# Altium footprint library texas.PCBLIB: 168 footprints (part 6 of 14)
Each footprint in its own frame and in the unit in brackets; x right, y up, seen from the top. Pads: shape width x height; smd on the part's side, far side on the other; paste and mask are expansions set on the pad; w line width, h text height; cw(c..) or ccw(c..) is an arc to the next point about the centre after c.
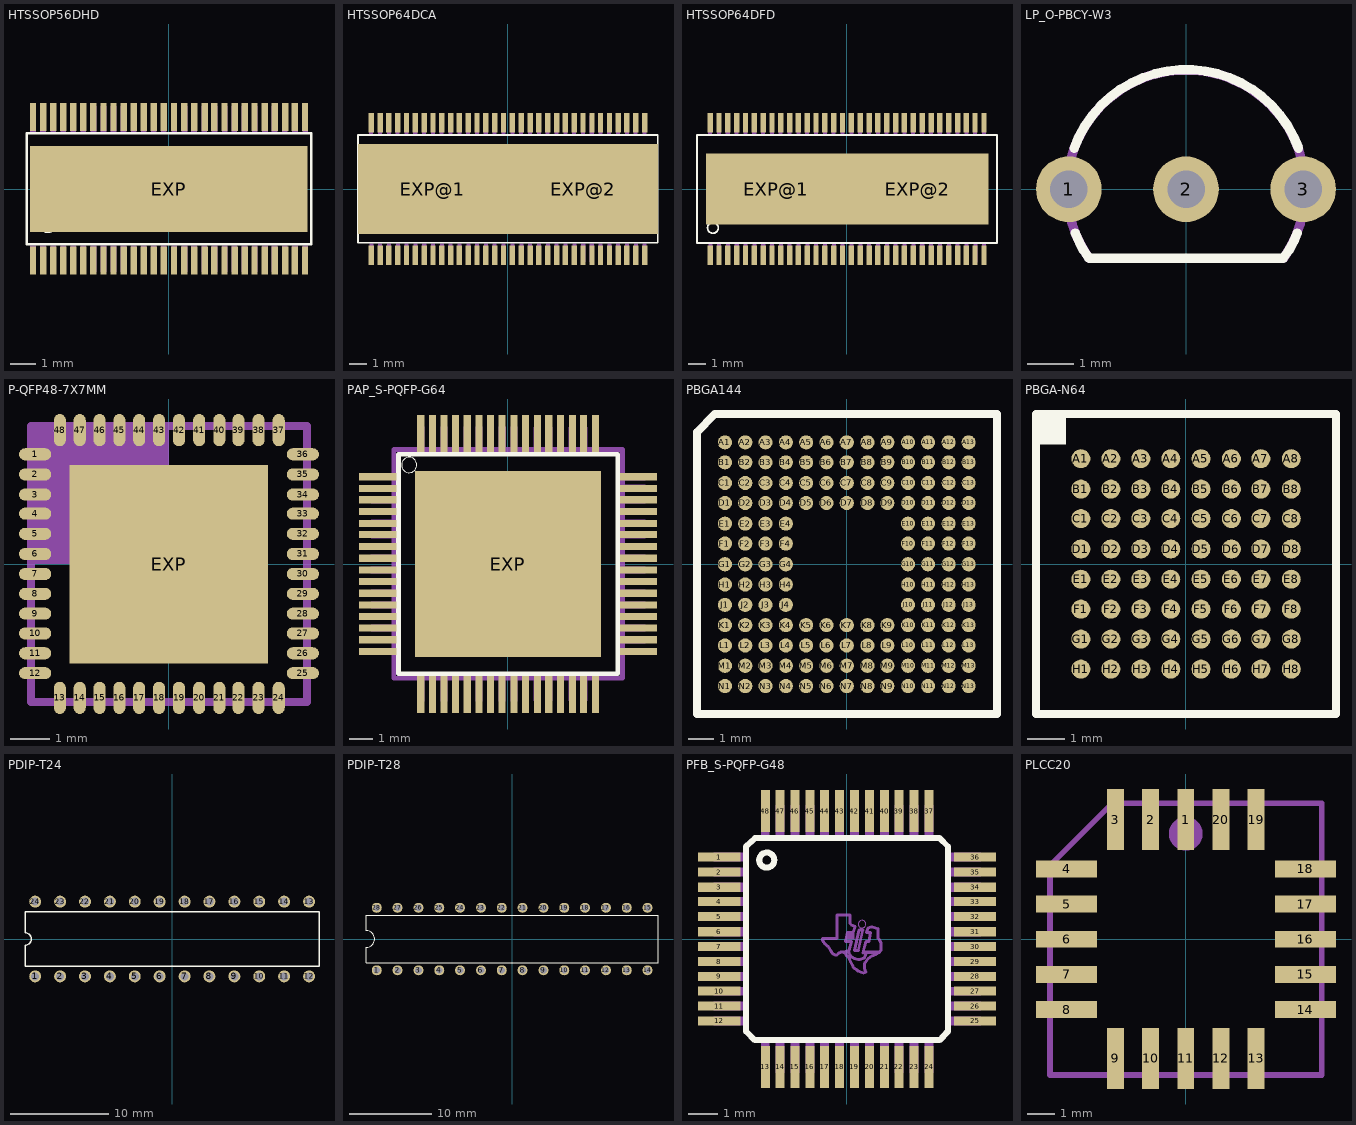
[diagram p5: the footprints below, top view; thin cyan lines are the x and y axes]

## HTSSOP56DHD [mil]
pads (57):
  rect 10x44 smd: 1(-212.6,-112.2) 2(-196.85,-112.2) 3(-181.1,-112.2) 4(-165.35,-112.2) 5(-149.61,-112.2) 6(-133.86,-112.2) 7(-118.11,-112.2) 8(-102.36,-112.2) 9(-86.61,-112.2) 10(-70.87,-112.2) 11(-55.12,-112.2) 12(-39.37,-112.2) 13(-23.62,-112.2) 14(-7.87,-112.2) 15(8,-112.2) 16(24,-112.2) 17(40,-112.2) 18(56,-112.2) 19(71,-112.2) 20(87,-112.2) 21(103,-112.2) 22(119,-112.2) 23(134,-112.2) 24(150,-112.2) 25(166,-112.2) 26(182,-112.2) 27(197,-112.2) 28(213,-112.2) 29(213,113) 30(197,113) 31(182,113) 32(166,113) 33(150,113) 34(134,113) 35(119,113) 36(103,113) 37(87,113) 38(71,113) 39(56,113) 40(40,113) 41(24,113) 42(8,113) 43(-7.87,113) 44(-23.62,113) 45(-39.37,113) 46(-55.12,113) 47(-70.87,113) 48(-86.61,113) 49(-102.36,113) 50(-118.11,113) 51(-133.86,113) 52(-149.61,113) 53(-165.35,113) 54(-181.1,113) 55(-196.85,113) 56(-212.6,113)
  rect 434x134 smd: EXP(0,0)
Top Overlay:
  circle w4: c-188.98,-55.12 r12
  lines w4: -222.44,-86.61 -222.44,87 223,87 223,-86.61 -222.44,-86.61
Top Paste:
  region: -208.27,134 -216.93,134 -216.93,92 -208.27,92
  region: -192.52,134 -201.18,134 -201.18,92 -192.52,92
  region: -176.77,134 -185.43,134 -185.43,92 -176.77,92
  region: -161.02,134 -169.69,134 -169.69,92 -161.02,92
  region: -145.28,134 -153.94,134 -153.94,92 -145.28,92
  region: -129.53,134 -138.19,134 -138.19,92 -129.53,92
  region: -113.78,134 -122.44,134 -122.44,92 -113.78,92
  region: -98.03,134 -106.69,134 -106.69,92 -98.03,92
  region: -82.28,134 -90.94,134 -90.94,92 -82.28,92
  region: -66.54,134 -75.2,134 -75.2,92 -66.54,92
  region: -50.79,134 -59.45,134 -59.45,92 -50.79,92
  region: -35.04,134 -43.7,134 -43.7,92 -35.04,92
  region: -19.29,134 -27.95,134 -27.95,92 -19.29,92
  region: -3.54,134 -12.2,134 -12.2,92 -3.54,92
  region: 13,134 4,134 4,92 13,92
  region: 28,134 20,134 20,92 28,92
  region: 44,134 36,134 36,92 44,92
  region: 60,134 51,134 51,92 60,92
  region: 76,134 67,134 67,92 76,92
  region: 91,134 83,134 83,92 91,92
  region: 107,134 99,134 99,92 107,92
  region: 123,134 114,134 114,92 123,92
  region: 139,134 130,134 130,92 139,92
  region: 154,134 146,134 146,92 154,92
  region: 170,134 162,134 162,92 170,92
  region: 186,134 177,134 177,92 186,92
  region: 202,134 193,134 193,92 202,92
  region: 217,134 209,134 209,92 217,92
  rectangle: 209,-133.27 217,-91.34
  rectangle: 193,-133.27 202,-91.34
  rectangle: 177,-133.27 186,-91.34
  rectangle: 162,-133.27 170,-91.34
  rectangle: 146,-133.27 154,-91.34
  rectangle: 130,-133.27 139,-91.34
  rectangle: 114,-133.27 123,-91.34
  rectangle: 99,-133.27 107,-91.34
  rectangle: 83,-133.27 91,-91.34
  rectangle: 67,-133.27 76,-91.34
  rectangle: 51,-133.27 60,-91.34
  rectangle: 36,-133.27 44,-91.34
  rectangle: 20,-133.27 28,-91.34
  rectangle: 4,-133.27 13,-91.34
  rectangle: -12.2,-133.27 -3.54,-91.34
  rectangle: -27.95,-133.27 -19.29,-91.34
  rectangle: -43.7,-133.27 -35.04,-91.34
  rectangle: -59.45,-133.27 -50.79,-91.34
  rectangle: -75.2,-133.27 -66.54,-91.34
  rectangle: -90.94,-133.27 -82.28,-91.34
  rectangle: -106.69,-133.27 -98.03,-91.34
  rectangle: -122.44,-133.27 -113.78,-91.34
  rectangle: -138.19,-133.27 -129.53,-91.34
  rectangle: -153.94,-133.27 -145.28,-91.34
  rectangle: -169.69,-133.27 -161.02,-91.34
  rectangle: -185.43,-133.27 -176.77,-91.34
  rectangle: -201.18,-133.27 -192.52,-91.34
  rectangle: -216.93,-133.27 -208.27,-91.34
Top Solder:
  rectangle: -216.54,-68.9 217,69
  region: -207.48,135 -217.72,135 -217.72,91 -207.48,91
  region: -191.73,135 -201.97,135 -201.97,91 -191.73,91
  region: -175.98,135 -186.22,135 -186.22,91 -175.98,91
  region: -160.24,135 -170.47,135 -170.47,91 -160.24,91
  region: -144.49,135 -154.72,135 -154.72,91 -144.49,91
  region: -128.74,135 -138.98,135 -138.98,91 -128.74,91
  region: -112.99,135 -123.23,135 -123.23,91 -112.99,91
  region: -97.24,135 -107.48,135 -107.48,91 -97.24,91
  region: -81.5,135 -91.73,135 -91.73,91 -81.5,91
  region: -65.75,135 -75.98,135 -75.98,91 -65.75,91
  region: -50,135 -60.24,135 -60.24,91 -50,91
  region: -34.25,135 -44.49,135 -44.49,91 -34.25,91
  region: -18.5,135 -28.74,135 -28.74,91 -18.5,91
  region: -2.76,135 -12.99,135 -12.99,91 -2.76,91
  region: 13,135 3,135 3,91 13,91
  region: 29,135 19,135 19,91 29,91
  region: 45,135 35,135 35,91 45,91
  region: 61,135 50,135 50,91 61,91
  region: 76,135 66,135 66,91 76,91
  region: 92,135 82,135 82,91 92,91
  region: 108,135 98,135 98,91 108,91
  region: 124,135 113,135 113,91 124,91
  region: 139,135 129,135 129,91 139,91
  region: 155,135 145,135 145,91 155,91
  region: 171,135 161,135 161,91 171,91
  region: 187,135 176,135 176,91 187,91
  region: 202,135 192,135 192,91 202,91
  region: 218,135 208,135 208,91 218,91
  rectangle: 208,-134.06 218,-90.35
  rectangle: 192,-134.06 202,-90.35
  rectangle: 176,-134.06 187,-90.35
  rectangle: 161,-134.06 171,-90.35
  rectangle: 145,-134.06 155,-90.35
  rectangle: 129,-134.06 139,-90.35
  rectangle: 113,-134.06 124,-90.35
  rectangle: 98,-134.06 108,-90.35
  rectangle: 82,-134.06 92,-90.35
  rectangle: 66,-134.06 76,-90.35
  rectangle: 50,-134.06 61,-90.35
  rectangle: 35,-134.06 45,-90.35
  rectangle: 19,-134.06 29,-90.35
  rectangle: 3,-134.06 13,-90.35
  rectangle: -12.99,-134.06 -2.76,-90.35
  rectangle: -28.74,-134.06 -18.5,-90.35
  rectangle: -44.49,-134.06 -34.25,-90.35
  rectangle: -60.24,-134.06 -50,-90.35
  rectangle: -75.98,-134.06 -65.75,-90.35
  rectangle: -91.73,-134.06 -81.5,-90.35
  rectangle: -107.48,-134.06 -97.24,-90.35
  rectangle: -123.23,-134.06 -112.99,-90.35
  rectangle: -138.98,-134.06 -128.74,-90.35
  rectangle: -154.72,-134.06 -144.49,-90.35
  rectangle: -170.47,-134.06 -160.24,-90.35
  rectangle: -186.22,-134.06 -175.98,-90.35
  rectangle: -201.97,-134.06 -191.73,-90.35
  rectangle: -217.72,-134.06 -207.48,-90.35
Mechanical 4:
  region: -208.07,130 -217.13,130 -217.13,89 -208.07,89
  region: -192.32,130 -201.38,130 -201.38,89 -192.32,89
  region: -176.57,130 -185.63,130 -185.63,89 -176.57,89
  region: -160.83,130 -169.88,130 -169.88,89 -160.83,89
  region: -145.08,130 -154.13,130 -154.13,89 -145.08,89
  region: -129.33,130 -138.39,130 -138.39,89 -129.33,89
  region: -113.58,130 -122.64,130 -122.64,89 -113.58,89
  region: -97.83,130 -106.89,130 -106.89,89 -97.83,89
  region: -82.09,130 -91.14,130 -91.14,89 -82.09,89
  region: -66.34,130 -75.39,130 -75.39,89 -66.34,89
  region: -50.59,130 -59.65,130 -59.65,89 -50.59,89
  region: -34.84,130 -43.9,130 -43.9,89 -34.84,89
  region: -19.09,130 -28.15,130 -28.15,89 -19.09,89
  region: -3.35,130 -12.4,130 -12.4,89 -3.35,89
  region: 13,130 4,130 4,89 13,89
  region: 29,130 20,130 20,89 29,89
  region: 44,130 35,130 35,89 44,89
  region: 60,130 51,130 51,89 60,89
  region: 76,130 67,130 67,89 76,89
  region: 92,130 83,130 83,89 92,89
  region: 107,130 98,130 98,89 107,89
  region: 123,130 114,130 114,89 123,89
  region: 139,130 130,130 130,89 139,89
  region: 155,130 146,130 146,89 155,89
  region: 170,130 161,130 161,89 170,89
  region: 186,130 177,130 177,89 186,89
  region: 202,130 193,130 193,89 202,89
  region: 218,130 209,130 209,89 218,89
  rectangle: 209,-129.92 218,-88.58
  rectangle: 193,-129.92 202,-88.58
  rectangle: 177,-129.92 186,-88.58
  rectangle: 161,-129.92 170,-88.58
  rectangle: 146,-129.92 155,-88.58
  rectangle: 130,-129.92 139,-88.58
  rectangle: 114,-129.92 123,-88.58
  rectangle: 98,-129.92 107,-88.58
  rectangle: 83,-129.92 92,-88.58
  rectangle: 67,-129.92 76,-88.58
  rectangle: 51,-129.92 60,-88.58
  rectangle: 35,-129.92 44,-88.58
  rectangle: 20,-129.92 29,-88.58
  rectangle: 4,-129.92 13,-88.58
  rectangle: -12.4,-129.92 -3.35,-88.58
  rectangle: -28.15,-129.92 -19.09,-88.58
  rectangle: -43.9,-129.92 -34.84,-88.58
  rectangle: -59.65,-129.92 -50.59,-88.58
  rectangle: -75.39,-129.92 -66.34,-88.58
  rectangle: -91.14,-129.92 -82.09,-88.58
  rectangle: -106.89,-129.92 -97.83,-88.58
  rectangle: -122.64,-129.92 -113.58,-88.58
  rectangle: -138.39,-129.92 -129.33,-88.58
  rectangle: -154.13,-129.92 -145.08,-88.58
  rectangle: -169.88,-129.92 -160.83,-88.58
  rectangle: -185.63,-129.92 -176.57,-88.58
  rectangle: -201.38,-129.92 -192.32,-88.58
  rectangle: -217.13,-129.92 -208.07,-88.58

## HTSSOP64DCA [mil]
pads (66):
  rect 12x44 smd: 1(-305.12,-147.64) 2(-285.43,-147.64) 3(-265.75,-147.64) 4(-246.06,-147.64) 5(-226.38,-147.64) 6(-206.69,-147.64) 7(-187.01,-147.64) 8(-167.32,-147.64) 9(-147.64,-147.64) 10(-127.95,-147.64) 11(-108.27,-147.64) 12(-88.58,-147.64) 13(-68.9,-147.64) 14(-49.21,-147.64) 15(-29.53,-147.64) 16(-9.84,-147.64) 17(10,-147.64) 18(30,-147.64) 19(50,-147.64) 20(69,-147.64) 21(89,-147.64) 22(109,-147.64) 23(128,-147.64) 24(148,-147.64) 25(168,-147.64) 26(188,-147.64) 27(207,-147.64) 28(227,-147.64) 29(247,-147.64) 30(266,-147.64) 31(286,-147.64) 32(306,-147.64) 33(306,148) 34(286,148) 35(266,148) 36(247,148) 37(227,148) 38(207,148) 39(188,148) 40(168,148) 41(148,148) 42(128,148) 43(109,148) 44(89,148) 45(69,148) 46(50,148) 47(30,148) 48(10,148) 49(-9.84,148) 50(-29.53,148) 51(-49.21,148) 52(-68.9,148) 53(-88.58,148) 54(-108.27,148) 55(-127.95,148) 56(-147.64,148) 57(-167.32,148) 58(-187.01,148) 59(-206.69,148) 60(-226.38,148) 61(-246.06,148) 62(-265.75,148) 63(-285.43,148) 64(-305.12,148)
  rect 335x201 smd: EXP@1(-167.32,0) EXP@2(168,0)
Top Overlay:
  circle w4: c-299.21,-86.61 r12
  lines w4: -334.65,-120.08 -334.65,121 335,121 335,-120.08 -334.65,-120.08
Top Paste:
  region: -299.61,169 -310.63,169 -310.63,127 -299.61,127
  region: -279.92,169 -290.94,169 -290.94,127 -279.92,127
  region: -260.24,169 -271.26,169 -271.26,127 -260.24,127
  region: -240.55,169 -251.57,169 -251.57,127 -240.55,127
  region: -220.87,169 -231.89,169 -231.89,127 -220.87,127
  region: -201.18,169 -212.2,169 -212.2,127 -201.18,127
  region: -181.5,169 -192.52,169 -192.52,127 -181.5,127
  region: -161.81,169 -172.83,169 -172.83,127 -161.81,127
  region: -142.13,169 -153.15,169 -153.15,127 -142.13,127
  region: -122.44,169 -133.46,169 -133.46,127 -122.44,127
  region: -102.76,169 -113.78,169 -113.78,127 -102.76,127
  region: -83.07,169 -94.09,169 -94.09,127 -83.07,127
  region: -63.39,169 -74.41,169 -74.41,127 -63.39,127
  region: -43.7,169 -54.72,169 -54.72,127 -43.7,127
  region: -24.02,169 -35.04,169 -35.04,127 -24.02,127
  region: -4.33,169 -15.35,169 -15.35,127 -4.33,127
  region: 16,169 5,169 5,127 16,127
  region: 36,169 25,169 25,127 36,127
  region: 55,169 44,169 44,127 55,127
  region: 75,169 64,169 64,127 75,127
  region: 95,169 84,169 84,127 95,127
  region: 114,169 103,169 103,127 114,127
  region: 134,169 123,169 123,127 134,127
  region: 154,169 143,169 143,127 154,127
  region: 173,169 162,169 162,127 173,127
  region: 193,169 182,169 182,127 193,127
  region: 213,169 202,169 202,127 213,127
  region: 232,169 221,169 221,127 232,127
  region: 252,169 241,169 241,127 252,127
  region: 272,169 261,169 261,127 272,127
  region: 291,169 280,169 280,127 291,127
  region: 311,169 300,169 300,127 311,127
  rectangle: 300,-168.7 311,-126.57
  rectangle: 280,-168.7 291,-126.57
  rectangle: 261,-168.7 272,-126.57
  rectangle: 241,-168.7 252,-126.57
  rectangle: 221,-168.7 232,-126.57
  rectangle: 202,-168.7 213,-126.57
  rectangle: 182,-168.7 193,-126.57
  rectangle: 162,-168.7 173,-126.57
  rectangle: 143,-168.7 154,-126.57
  rectangle: 123,-168.7 134,-126.57
  rectangle: 103,-168.7 114,-126.57
  rectangle: 84,-168.7 95,-126.57
  rectangle: 64,-168.7 75,-126.57
  rectangle: 44,-168.7 55,-126.57
  rectangle: 25,-168.7 36,-126.57
  rectangle: 5,-168.7 16,-126.57
  rectangle: -15.35,-168.7 -4.33,-126.57
  rectangle: -35.04,-168.7 -24.02,-126.57
  rectangle: -54.72,-168.7 -43.7,-126.57
  rectangle: -74.41,-168.7 -63.39,-126.57
  rectangle: -94.09,-168.7 -83.07,-126.57
  rectangle: -113.78,-168.7 -102.76,-126.57
  rectangle: -133.46,-168.7 -122.44,-126.57
  rectangle: -153.15,-168.7 -142.13,-126.57
  rectangle: -172.83,-168.7 -161.81,-126.57
  rectangle: -192.52,-168.7 -181.5,-126.57
  rectangle: -212.2,-168.7 -201.18,-126.57
  rectangle: -231.89,-168.7 -220.87,-126.57
  rectangle: -251.57,-168.7 -240.55,-126.57
  rectangle: -271.26,-168.7 -260.24,-126.57
  rectangle: -290.94,-168.7 -279.92,-126.57
  rectangle: -310.63,-168.7 -299.61,-126.57
Top Solder:
  rectangle: -334.65,-100.39 335,100
  region: -299.02,170 -311.22,170 -311.22,126 -299.02,126
  region: -279.33,170 -291.54,170 -291.54,126 -279.33,126
  region: -259.65,170 -271.85,170 -271.85,126 -259.65,126
  region: -239.96,170 -252.17,170 -252.17,126 -239.96,126
  region: -220.28,170 -232.48,170 -232.48,126 -220.28,126
  region: -200.59,170 -212.8,170 -212.8,126 -200.59,126
  region: -180.91,170 -193.11,170 -193.11,126 -180.91,126
  region: -161.22,170 -173.43,170 -173.43,126 -161.22,126
  region: -141.54,170 -153.74,170 -153.74,126 -141.54,126
  region: -121.85,170 -134.06,170 -134.06,126 -121.85,126
  region: -102.17,170 -114.37,170 -114.37,126 -102.17,126
  region: -82.48,170 -94.69,170 -94.69,126 -82.48,126
  region: -62.8,170 -75,170 -75,126 -62.8,126
  region: -43.11,170 -55.31,170 -55.31,126 -43.11,126
  region: -23.43,170 -35.63,170 -35.63,126 -23.43,126
  region: -3.74,170 -15.94,170 -15.94,126 -3.74,126
  region: 16,170 4,170 4,126 16,126
  region: 36,170 24,170 24,126 36,126
  region: 56,170 44,170 44,126 56,126
  region: 75,170 63,170 63,126 75,126
  region: 95,170 83,170 83,126 95,126
  region: 115,170 103,170 103,126 115,126
  region: 135,170 122,170 122,126 135,126
  region: 154,170 142,170 142,126 154,126
  region: 174,170 162,170 162,126 174,126
  region: 194,170 181,170 181,126 194,126
  region: 213,170 201,170 201,126 213,126
  region: 233,170 221,170 221,126 233,126
  region: 253,170 240,170 240,126 253,126
  region: 272,170 260,170 260,126 272,126
  region: 292,170 280,170 280,126 292,126
  region: 312,170 300,170 300,126 312,126
  rectangle: 300,-169.49 312,-125.79
  rectangle: 280,-169.49 292,-125.79
  rectangle: 260,-169.49 272,-125.79
  rectangle: 240,-169.49 253,-125.79
  rectangle: 221,-169.49 233,-125.79
  rectangle: 201,-169.49 213,-125.79
  rectangle: 181,-169.49 194,-125.79
  rectangle: 162,-169.49 174,-125.79
  rectangle: 142,-169.49 154,-125.79
  rectangle: 122,-169.49 135,-125.79
  rectangle: 103,-169.49 115,-125.79
  rectangle: 83,-169.49 95,-125.79
  rectangle: 63,-169.49 75,-125.79
  rectangle: 44,-169.49 56,-125.79
  rectangle: 24,-169.49 36,-125.79
  rectangle: 4,-169.49 16,-125.79
  rectangle: -15.94,-169.49 -3.74,-125.79
  rectangle: -35.63,-169.49 -23.43,-125.79
  rectangle: -55.31,-169.49 -43.11,-125.79
  rectangle: -75,-169.49 -62.8,-125.79
  rectangle: -94.69,-169.49 -82.48,-125.79
  rectangle: -114.37,-169.49 -102.17,-125.79
  rectangle: -134.06,-169.49 -121.85,-125.79
  rectangle: -153.74,-169.49 -141.54,-125.79
  rectangle: -173.43,-169.49 -161.22,-125.79
  rectangle: -193.11,-169.49 -180.91,-125.79
  rectangle: -212.8,-169.49 -200.59,-125.79
  rectangle: -232.48,-169.49 -220.28,-125.79
  rectangle: -252.17,-169.49 -239.96,-125.79
  rectangle: -271.85,-169.49 -259.65,-125.79
  rectangle: -291.54,-169.49 -279.33,-125.79
  rectangle: -311.22,-169.49 -299.02,-125.79
Mechanical 4:
  region: -300.79,164 -309.84,164 -309.84,122 -300.79,122
  region: -281.1,164 -290.16,164 -290.16,122 -281.1,122
  region: -261.42,164 -270.47,164 -270.47,122 -261.42,122
  region: -241.73,164 -250.79,164 -250.79,122 -241.73,122
  region: -222.05,164 -231.1,164 -231.1,122 -222.05,122
  region: -202.36,164 -211.42,164 -211.42,122 -202.36,122
  region: -182.68,164 -191.73,164 -191.73,122 -182.68,122
  region: -162.99,164 -172.05,164 -172.05,122 -162.99,122
  region: -143.31,164 -152.36,164 -152.36,122 -143.31,122
  region: -123.62,164 -132.68,164 -132.68,122 -123.62,122
  region: -103.94,164 -112.99,164 -112.99,122 -103.94,122
  region: -84.25,164 -93.31,164 -93.31,122 -84.25,122
  region: -64.57,164 -73.62,164 -73.62,122 -64.57,122
  region: -44.88,164 -53.94,164 -53.94,122 -44.88,122
  region: -25.2,164 -34.25,164 -34.25,122 -25.2,122
  region: -5.51,164 -14.57,164 -14.57,122 -5.51,122
  region: 15,164 6,164 6,122 15,122
  region: 34,164 25,164 25,122 34,122
  region: 54,164 45,164 45,122 54,122
  region: 74,164 65,164 65,122 74,122
  region: 93,164 84,164 84,122 93,122
  region: 113,164 104,164 104,122 113,122
  region: 133,164 124,164 124,122 133,122
  region: 152,164 143,164 143,122 152,122
  region: 172,164 163,164 163,122 172,122
  region: 192,164 183,164 183,122 192,122
  region: 212,164 202,164 202,122 212,122
  region: 231,164 222,164 222,122 231,122
  region: 251,164 242,164 242,122 251,122
  region: 271,164 262,164 262,122 271,122
  region: 290,164 281,164 281,122 290,122
  region: 310,164 301,164 301,122 310,122
  rectangle: 301,-163.39 310,-121.85
  rectangle: 282,-163.39 291,-121.85
  rectangle: 262,-163.39 271,-121.85
  rectangle: 242,-163.39 251,-121.85
  rectangle: 223,-163.39 232,-121.85
  rectangle: 203,-163.39 212,-121.85
  rectangle: 183,-163.39 192,-121.85
  rectangle: 163,-163.39 173,-121.85
  rectangle: 144,-163.39 153,-121.85
  rectangle: 124,-163.39 133,-121.85
  rectangle: 104,-163.39 113,-121.85
  rectangle: 85,-163.39 94,-121.85
  rectangle: 65,-163.39 74,-121.85
  rectangle: 45,-163.39 54,-121.85
  rectangle: 26,-163.39 35,-121.85
  rectangle: 6,-163.39 15,-121.85
  rectangle: -14.17,-163.39 -5.12,-121.85
  rectangle: -33.86,-163.39 -24.8,-121.85
  rectangle: -53.54,-163.39 -44.49,-121.85
  rectangle: -73.23,-163.39 -64.17,-121.85
  rectangle: -92.91,-163.39 -83.86,-121.85
  rectangle: -112.6,-163.39 -103.54,-121.85
  rectangle: -132.28,-163.39 -123.23,-121.85
  rectangle: -151.97,-163.39 -142.91,-121.85
  rectangle: -171.65,-163.39 -162.6,-121.85
  rectangle: -191.34,-163.39 -182.28,-121.85
  rectangle: -211.02,-163.39 -201.97,-121.85
  rectangle: -230.71,-163.39 -221.65,-121.85
  rectangle: -250.39,-163.39 -241.34,-121.85
  rectangle: -270.08,-163.39 -261.02,-121.85
  rectangle: -289.76,-163.39 -280.71,-121.85
  rectangle: -309.45,-163.39 -300.39,-121.85

## HTSSOP64DFD [mil]
pads (66):
  rect 12x44 smd: 1(-305.12,-147.64) 2(-285.43,-147.64) 3(-265.75,-147.64) 4(-246.06,-147.64) 5(-226.38,-147.64) 6(-206.69,-147.64) 7(-187.01,-147.64) 8(-167.32,-147.64) 9(-147.64,-147.64) 10(-127.95,-147.64) 11(-108.27,-147.64) 12(-88.58,-147.64) 13(-68.9,-147.64) 14(-49.21,-147.64) 15(-29.53,-147.64) 16(-9.84,-147.64) 17(10,-147.64) 18(30,-147.64) 19(50,-147.64) 20(69,-147.64) 21(89,-147.64) 22(109,-147.64) 23(128,-147.64) 24(148,-147.64) 25(168,-147.64) 26(188,-147.64) 27(207,-147.64) 28(227,-147.64) 29(247,-147.64) 30(266,-147.64) 31(286,-147.64) 32(306,-147.64) 33(306,148) 34(286,148) 35(266,148) 36(247,148) 37(227,148) 38(207,148) 39(188,148) 40(168,148) 41(148,148) 42(128,148) 43(109,148) 44(89,148) 45(69,148) 46(50,148) 47(30,148) 48(10,148) 49(-9.84,148) 50(-29.53,148) 51(-49.21,148) 52(-68.9,148) 53(-88.58,148) 54(-108.27,148) 55(-127.95,148) 56(-147.64,148) 57(-167.32,148) 58(-187.01,148) 59(-206.69,148) 60(-226.38,148) 61(-246.06,148) 62(-265.75,148) 63(-285.43,148) 64(-305.12,148)
  rect 315x158 smd: EXP@1(-157.48,0) EXP@2(158,0)
Top Overlay:
  circle w4: c-299.21,-86.61 r12
  lines w4: -334.65,-120.08 -334.65,121 335,121 335,-120.08 -334.65,-120.08
Top Paste:
  region: -299.61,169 -310.63,169 -310.63,127 -299.61,127
  region: -279.92,169 -290.94,169 -290.94,127 -279.92,127
  region: -260.24,169 -271.26,169 -271.26,127 -260.24,127
  region: -240.55,169 -251.57,169 -251.57,127 -240.55,127
  region: -220.87,169 -231.89,169 -231.89,127 -220.87,127
  region: -201.18,169 -212.2,169 -212.2,127 -201.18,127
  region: -181.5,169 -192.52,169 -192.52,127 -181.5,127
  region: -161.81,169 -172.83,169 -172.83,127 -161.81,127
  region: -142.13,169 -153.15,169 -153.15,127 -142.13,127
  region: -122.44,169 -133.46,169 -133.46,127 -122.44,127
  region: -102.76,169 -113.78,169 -113.78,127 -102.76,127
  region: -83.07,169 -94.09,169 -94.09,127 -83.07,127
  region: -63.39,169 -74.41,169 -74.41,127 -63.39,127
  region: -43.7,169 -54.72,169 -54.72,127 -43.7,127
  region: -24.02,169 -35.04,169 -35.04,127 -24.02,127
  region: -4.33,169 -15.35,169 -15.35,127 -4.33,127
  region: 16,169 5,169 5,127 16,127
  region: 36,169 25,169 25,127 36,127
  region: 55,169 44,169 44,127 55,127
  region: 75,169 64,169 64,127 75,127
  region: 95,169 84,169 84,127 95,127
  region: 114,169 103,169 103,127 114,127
  region: 134,169 123,169 123,127 134,127
  region: 154,169 143,169 143,127 154,127
  region: 173,169 162,169 162,127 173,127
  region: 193,169 182,169 182,127 193,127
  region: 213,169 202,169 202,127 213,127
  region: 232,169 221,169 221,127 232,127
  region: 252,169 241,169 241,127 252,127
  region: 272,169 261,169 261,127 272,127
  region: 291,169 280,169 280,127 291,127
  region: 311,169 300,169 300,127 311,127
  rectangle: 300,-168.7 311,-126.57
  rectangle: 280,-168.7 291,-126.57
  rectangle: 261,-168.7 272,-126.57
  rectangle: 241,-168.7 252,-126.57
  rectangle: 221,-168.7 232,-126.57
  rectangle: 202,-168.7 213,-126.57
  rectangle: 182,-168.7 193,-126.57
  rectangle: 162,-168.7 173,-126.57
  rectangle: 143,-168.7 154,-126.57
  rectangle: 123,-168.7 134,-126.57
  rectangle: 103,-168.7 114,-126.57
  rectangle: 84,-168.7 95,-126.57
  rectangle: 64,-168.7 75,-126.57
  rectangle: 44,-168.7 55,-126.57
  rectangle: 25,-168.7 36,-126.57
  rectangle: 5,-168.7 16,-126.57
  rectangle: -15.35,-168.7 -4.33,-126.57
  rectangle: -35.04,-168.7 -24.02,-126.57
  rectangle: -54.72,-168.7 -43.7,-126.57
  rectangle: -74.41,-168.7 -63.39,-126.57
  rectangle: -94.09,-168.7 -83.07,-126.57
  rectangle: -113.78,-168.7 -102.76,-126.57
  rectangle: -133.46,-168.7 -122.44,-126.57
  rectangle: -153.15,-168.7 -142.13,-126.57
  rectangle: -172.83,-168.7 -161.81,-126.57
  rectangle: -192.52,-168.7 -181.5,-126.57
  rectangle: -212.2,-168.7 -201.18,-126.57
  rectangle: -231.89,-168.7 -220.87,-126.57
  rectangle: -251.57,-168.7 -240.55,-126.57
  rectangle: -271.26,-168.7 -260.24,-126.57
  rectangle: -290.94,-168.7 -279.92,-126.57
  rectangle: -310.63,-168.7 -299.61,-126.57
Top Solder:
  rectangle: -314.96,-78.74 315,79
  region: -299.02,170 -311.22,170 -311.22,126 -299.02,126
  region: -279.33,170 -291.54,170 -291.54,126 -279.33,126
  region: -259.65,170 -271.85,170 -271.85,126 -259.65,126
  region: -239.96,170 -252.17,170 -252.17,126 -239.96,126
  region: -220.28,170 -232.48,170 -232.48,126 -220.28,126
  region: -200.59,170 -212.8,170 -212.8,126 -200.59,126
  region: -180.91,170 -193.11,170 -193.11,126 -180.91,126
  region: -161.22,170 -173.43,170 -173.43,126 -161.22,126
  region: -141.54,170 -153.74,170 -153.74,126 -141.54,126
  region: -121.85,170 -134.06,170 -134.06,126 -121.85,126
  region: -102.17,170 -114.37,170 -114.37,126 -102.17,126
  region: -82.48,170 -94.69,170 -94.69,126 -82.48,126
  region: -62.8,170 -75,170 -75,126 -62.8,126
  region: -43.11,170 -55.31,170 -55.31,126 -43.11,126
  region: -23.43,170 -35.63,170 -35.63,126 -23.43,126
  region: -3.74,170 -15.94,170 -15.94,126 -3.74,126
  region: 16,170 4,170 4,126 16,126
  region: 36,170 24,170 24,126 36,126
  region: 56,170 44,170 44,126 56,126
  region: 75,170 63,170 63,126 75,126
  region: 95,170 83,170 83,126 95,126
  region: 115,170 103,170 103,126 115,126
  region: 135,170 122,170 122,126 135,126
  region: 154,170 142,170 142,126 154,126
  region: 174,170 162,170 162,126 174,126
  region: 194,170 181,170 181,126 194,126
  region: 213,170 201,170 201,126 213,126
  region: 233,170 221,170 221,126 233,126
  region: 253,170 240,170 240,126 253,126
  region: 272,170 260,170 260,126 272,126
  region: 292,170 280,170 280,126 292,126
  region: 312,170 300,170 300,126 312,126
  rectangle: 300,-169.49 312,-125.79
  rectangle: 280,-169.49 292,-125.79
  rectangle: 260,-169.49 272,-125.79
  rectangle: 240,-169.49 253,-125.79
  rectangle: 221,-169.49 233,-125.79
  rectangle: 201,-169.49 213,-125.79
  rectangle: 181,-169.49 194,-125.79
  rectangle: 162,-169.49 174,-125.79
  rectangle: 142,-169.49 154,-125.79
  rectangle: 122,-169.49 135,-125.79
  rectangle: 103,-169.49 115,-125.79
  rectangle: 83,-169.49 95,-125.79
  rectangle: 63,-169.49 75,-125.79
  rectangle: 44,-169.49 56,-125.79
  rectangle: 24,-169.49 36,-125.79
  rectangle: 4,-169.49 16,-125.79
  rectangle: -15.94,-169.49 -3.74,-125.79
  rectangle: -35.63,-169.49 -23.43,-125.79
  rectangle: -55.31,-169.49 -43.11,-125.79
  rectangle: -75,-169.49 -62.8,-125.79
  rectangle: -94.69,-169.49 -82.48,-125.79
  rectangle: -114.37,-169.49 -102.17,-125.79
  rectangle: -134.06,-169.49 -121.85,-125.79
  rectangle: -153.74,-169.49 -141.54,-125.79
  rectangle: -173.43,-169.49 -161.22,-125.79
  rectangle: -193.11,-169.49 -180.91,-125.79
  rectangle: -212.8,-169.49 -200.59,-125.79
  rectangle: -232.48,-169.49 -220.28,-125.79
  rectangle: -252.17,-169.49 -239.96,-125.79
  rectangle: -271.85,-169.49 -259.65,-125.79
  rectangle: -291.54,-169.49 -279.33,-125.79
  rectangle: -311.22,-169.49 -299.02,-125.79
Mechanical 4:
  region: -300.79,164 -309.84,164 -309.84,122 -300.79,122
  region: -281.1,164 -290.16,164 -290.16,122 -281.1,122
  region: -261.42,164 -270.47,164 -270.47,122 -261.42,122
  region: -241.73,164 -250.79,164 -250.79,122 -241.73,122
  region: -222.05,164 -231.1,164 -231.1,122 -222.05,122
  region: -202.36,164 -211.42,164 -211.42,122 -202.36,122
  region: -182.68,164 -191.73,164 -191.73,122 -182.68,122
  region: -162.99,164 -172.05,164 -172.05,122 -162.99,122
  region: -143.31,164 -152.36,164 -152.36,122 -143.31,122
  region: -123.62,164 -132.68,164 -132.68,122 -123.62,122
  region: -103.94,164 -112.99,164 -112.99,122 -103.94,122
  region: -84.25,164 -93.31,164 -93.31,122 -84.25,122
  region: -64.57,164 -73.62,164 -73.62,122 -64.57,122
  region: -44.88,164 -53.94,164 -53.94,122 -44.88,122
  region: -25.2,164 -34.25,164 -34.25,122 -25.2,122
  region: -5.51,164 -14.57,164 -14.57,122 -5.51,122
  region: 15,164 6,164 6,122 15,122
  region: 34,164 25,164 25,122 34,122
  region: 54,164 45,164 45,122 54,122
  region: 74,164 65,164 65,122 74,122
  region: 93,164 84,164 84,122 93,122
  region: 113,164 104,164 104,122 113,122
  region: 133,164 124,164 124,122 133,122
  region: 152,164 143,164 143,122 152,122
  region: 172,164 163,164 163,122 172,122
  region: 192,164 183,164 183,122 192,122
  region: 212,164 202,164 202,122 212,122
  region: 231,164 222,164 222,122 231,122
  region: 251,164 242,164 242,122 251,122
  region: 271,164 262,164 262,122 271,122
  region: 290,164 281,164 281,122 290,122
  region: 310,164 301,164 301,122 310,122
  rectangle: 301,-163.39 310,-121.85
  rectangle: 282,-163.39 291,-121.85
  rectangle: 262,-163.39 271,-121.85
  rectangle: 242,-163.39 251,-121.85
  rectangle: 223,-163.39 232,-121.85
  rectangle: 203,-163.39 212,-121.85
  rectangle: 183,-163.39 192,-121.85
  rectangle: 163,-163.39 173,-121.85
  rectangle: 144,-163.39 153,-121.85
  rectangle: 124,-163.39 133,-121.85
  rectangle: 104,-163.39 113,-121.85
  rectangle: 85,-163.39 94,-121.85
  rectangle: 65,-163.39 74,-121.85
  rectangle: 45,-163.39 54,-121.85
  rectangle: 26,-163.39 35,-121.85
  rectangle: 6,-163.39 15,-121.85
  rectangle: -14.17,-163.39 -5.12,-121.85
  rectangle: -33.86,-163.39 -24.8,-121.85
  rectangle: -53.54,-163.39 -44.49,-121.85
  rectangle: -73.23,-163.39 -64.17,-121.85
  rectangle: -92.91,-163.39 -83.86,-121.85
  rectangle: -112.6,-163.39 -103.54,-121.85
  rectangle: -132.28,-163.39 -123.23,-121.85
  rectangle: -151.97,-163.39 -142.91,-121.85
  rectangle: -171.65,-163.39 -162.6,-121.85
  rectangle: -191.34,-163.39 -182.28,-121.85
  rectangle: -211.02,-163.39 -201.97,-121.85
  rectangle: -230.71,-163.39 -221.65,-121.85
  rectangle: -250.39,-163.39 -241.34,-121.85
  rectangle: -270.08,-163.39 -261.02,-121.85
  rectangle: -289.76,-163.39 -280.71,-121.85
  rectangle: -309.45,-163.39 -300.39,-121.85

## LP_O-PBCY-W3 [mil]
pads (3):
  round 56 hole 32: 1(-100,0) 2(0,0) 3(100,0)
Top Overlay:
  lines w8: -95.47,35 cw(c0.26,0.27) 96,35 ; -94.49,-37.4 ccw(c-11.81,-6.35) -82.68,-59.06 83,-59.06 ccw(c12.23,-5.68) 95,-37.4
Mechanical 4:
  lines w8: -82.68,-59.06 cw(c0.16,0.02) 83,-59.06

## P-QFP48-7X7MM [mil]
pads (49):
  rrect100% 32x12 smd: 1(-132.87,109) 2(-132.87,89) 3(-132.87,69) 4(-132.87,50) 5(-132.87,30) 6(-132.87,10) 7(-132.87,-9.84) 8(-132.87,-29.53) 9(-132.87,-49.21) 10(-132.87,-68.9) 11(-132.87,-88.58) 12(-132.87,-108.27) 25(133,-108.27) 26(133,-88.58) 27(133,-68.9) 28(133,-49.21) 29(133,-29.53) 30(133,-9.84) 31(133,10) 32(133,30) 33(133,50) 34(133,69) 35(133,89) 36(133,109)
  rrect100% 12x32 smd: 13(-108.27,-132.87) 14(-88.58,-132.87) 15(-68.9,-132.87) 16(-49.21,-132.87) 17(-29.53,-132.87) 18(-9.84,-132.87) 19(10,-132.87) 20(30,-132.87) 21(50,-132.87) 22(69,-132.87) 23(89,-132.87) 24(109,-132.87) 37(109,133) 38(89,133) 39(69,133) 40(50,133) 41(30,133) 42(10,133) 43(-9.84,133) 44(-29.53,133) 45(-49.21,133) 46(-68.9,133) 47(-88.58,133) 48(-108.27,133)
  rect 197x197 smd: EXP(0,0)
Mechanical 4:
  circle w0: c-98.43,99 r14
  rectangle: -137.8,0 0,138
  lines w8: -136.75,-136.75 137,-136.75 137,137 -136.75,137 -136.75,-136.75

## PAP_S-PQFP-G64 [mil]
pads (65):
  rect 63x12 smd: 1(-220.47,148) 2(-220.47,128) 3(-220.47,109) 4(-220.47,89) 5(-220.47,69) 6(-220.47,50) 7(-220.47,30) 8(-220.47,10) 9(-220.47,-9.84) 10(-220.47,-29.53) 11(-220.47,-49.21) 12(-220.47,-68.9) 13(-220.47,-88.58) 14(-220.47,-108.27) 15(-220.47,-127.95) 16(-220.47,-147.64) 33(221,-147.64) 34(221,-127.95) 35(221,-108.27) 36(221,-88.58) 37(221,-68.9) 38(221,-49.21) 39(221,-29.53) 40(221,-9.84) 41(221,10) 42(221,30) 43(221,50) 44(221,69) 45(221,89) 46(221,109) 47(221,128) 48(221,148)
  rect 12x63 smd: 17(-147.64,-220.47) 18(-127.95,-220.47) 19(-108.27,-220.47) 20(-88.58,-220.47) 21(-68.9,-220.47) 22(-49.21,-220.47) 23(-29.53,-220.47) 24(-9.84,-220.47) 25(10,-220.47) 26(30,-220.47) 27(50,-220.47) 28(69,-220.47) 29(89,-220.47) 30(109,-220.47) 31(128,-220.47) 32(148,-220.47) 49(148,221) 50(128,221) 51(109,221) 52(89,221) 53(69,221) 54(50,221) 55(30,221) 56(10,221) 57(-9.84,221) 58(-29.53,221) 59(-49.21,221) 60(-68.9,221) 61(-88.58,221) 62(-108.27,221) 63(-127.95,221) 64(-147.64,221)
  rect 315x315 smd: EXP(0,0)
Top Overlay:
  circle w0: c-167.32,168 r13
  lines w8: -185.43,-185.43 186,-185.43 186,186 -185.43,186 -185.43,-185.43
Top Paste:
  rectangle: -125.98,-125 126,126
Top Solder:
  rectangle: -253.94,141 -187.99,155
  rectangle: -253.94,122 -187.99,135
  rectangle: -253.94,102 -187.99,116
  rectangle: -253.94,82 -187.99,96
  rectangle: -253.94,63 -187.99,76
  rectangle: -253.94,43 -187.99,57
  rectangle: -253.94,23 -187.99,37
  rectangle: -253.94,3 -187.99,17
  rectangle: -253.94,-16.73 -187.99,-2.95
  rectangle: -253.94,-36.42 -187.99,-22.64
  rectangle: -253.94,-56.1 -187.99,-42.32
  rectangle: -253.94,-75.79 -187.99,-62.01
  rectangle: -253.94,-95.47 -187.99,-81.69
  rectangle: -253.94,-115.16 -187.99,-101.38
  rectangle: -253.94,-134.84 -187.99,-121.06
  rectangle: -253.94,-154.53 -187.99,-140.75
  region: -140.75,-253.94 -140.75,-187.99 -154.53,-187.99 -154.53,-253.94
  region: -121.06,-253.94 -121.06,-187.99 -134.84,-187.99 -134.84,-253.94
  region: -101.38,-253.94 -101.38,-187.99 -115.16,-187.99 -115.16,-253.94
  region: -81.69,-253.94 -81.69,-187.99 -95.47,-187.99 -95.47,-253.94
  region: -62.01,-253.94 -62.01,-187.99 -75.79,-187.99 -75.79,-253.94
  region: -42.32,-253.94 -42.32,-187.99 -56.1,-187.99 -56.1,-253.94
  region: -22.36,-254.21 -22.36,-187.71 -36.14,-187.71 -36.14,-254.21
  region: -2.52,-254.37 -2.52,-187.56 -16.3,-187.56 -16.3,-254.37
  region: 16.82,-254.03 16.82,-187.9 3.05,-187.9 3.05,-254.03
  region: 36.67,-254.19 36.67,-187.74 22.89,-187.74 22.89,-254.19
  region: 56.89,-253.96 56.89,-187.96 43.11,-187.96 43.11,-253.96
  region: 75.89,-253.96 75.89,-187.96 62.11,-187.96 62.11,-253.96
  region: 95.89,-253.96 95.89,-187.96 82.11,-187.96 82.11,-253.96
  region: 115.89,-253.96 115.89,-187.96 102.11,-187.96 102.11,-253.96
  region: 134.89,-253.96 134.89,-187.96 121.11,-187.96 121.11,-253.96
  region: 154.89,-253.96 154.89,-187.96 141.11,-187.96 141.11,-253.96
  region: 254,-140.75 188,-140.75 188,-154.53 254,-154.53
  region: 254,-121.06 188,-121.06 188,-134.84 254,-134.84
  region: 254,-101.38 188,-101.38 188,-115.16 254,-115.16
  region: 254,-81.69 188,-81.69 188,-95.47 254,-95.47
  region: 254,-62.01 188,-62.01 188,-75.79 254,-75.79
  region: 254,-42.32 188,-42.32 188,-56.1 254,-56.1
  region: 254,-22.64 188,-22.64 188,-36.42 254,-36.42
  region: 254,-2.95 188,-2.95 188,-16.73 254,-16.73
  region: 254,17 188,17 188,3 254,3
  region: 254,37 188,37 188,23 254,23
  region: 254,57 188,57 188,43 254,43
  region: 254,76 188,76 188,63 254,63
  region: 254,96 188,96 188,82 254,82
  region: 254,116 188,116 188,102 254,102
  region: 254,135 188,135 188,122 254,122
  region: 254,155 188,155 188,141 254,141
  region: 141.5,254.5 141.5,188.5 154.5,188.5 154.5,254.5
  region: 121.5,254.5 121.5,188.5 134.5,188.5 134.5,254.5
  region: 102.5,254.5 102.5,188.5 115.5,188.5 115.5,254.5
  region: 82.5,254.5 82.5,188.5 95.5,188.5 95.5,254.5
  region: 62.5,254.5 62.5,188.5 75.5,188.5 75.5,254.5
  region: 43.5,254.5 43.5,188.5 56.5,188.5 56.5,254.5
  region: 23.28,254.72 23.28,188.28 36.28,188.28 36.28,254.72
  region: 3.44,254.56 3.44,188.44 16.44,188.44 16.44,254.56
  region: -15.91,254.91 -15.91,188.09 -2.91,188.09 -2.91,254.91
  region: -35.75,254.75 -35.75,188.25 -22.75,188.25 -22.75,254.75
  region: -55.71,254.47 -55.71,188.53 -42.71,188.53 -42.71,254.47
  region: -75.4,254.47 -75.4,188.53 -62.4,188.53 -62.4,254.47
  region: -95.08,254.47 -95.08,188.53 -82.08,188.53 -82.08,254.47
  region: -114.77,254.47 -114.77,188.53 -101.77,188.53 -101.77,254.47
  region: -134.45,254.47 -134.45,188.53 -121.45,188.53 -121.45,254.47
  region: -154.14,254.47 -154.14,188.53 -141.14,188.53 -141.14,254.47
  rectangle: -158.46,-158.46 159,159
Mechanical 4:
  region: -232.58,153.91 -232.58,142.09 -194.58,142.09 -194.58,153.91
  region: -232.08,134.4 -232.08,122.6 -195.08,122.6 -195.08,134.4
  region: -232.08,114.41 -232.08,102.59 -195.08,102.59 -195.08,114.41
  region: -232.58,94.9 -232.58,83.1 -194.58,83.1 -194.58,94.9
  region: -232.08,75.41 -232.08,63.59 -195.08,63.59 -195.08,75.41
  region: -232.08,55.4 -232.08,43.6 -195.08,43.6 -195.08,55.4
  region: -232.58,35.91 -232.58,24.09 -194.58,24.09 -194.58,35.91
  region: -232.5,15.98 -232.5,4.17 -194.65,4.17 -194.65,15.98
  region: -232.35,-3.87 -232.35,-15.68 -194.81,-15.68 -194.81,-3.87
  region: -232.28,-23.62 -232.28,-35.43 -194.88,-35.43 -194.88,-23.62
  region: -232.28,-43.31 -232.28,-55.11 -194.88,-55.11 -194.88,-43.31
  region: -232.28,-62.99 -232.28,-74.8 -194.88,-74.8 -194.88,-62.99
  region: -232.28,-82.68 -232.28,-94.48 -194.88,-94.48 -194.88,-82.68
  region: -232.28,-102.36 -232.28,-114.17 -194.88,-114.17 -194.88,-102.36
  region: -232.28,-122.05 -232.28,-133.85 -194.88,-133.85 -194.88,-122.05
  region: -232.28,-141.73 -232.28,-153.54 -194.88,-153.54 -194.88,-141.73
  region: -153.54,-194.88 -153.54,-232.28 -141.73,-232.28 -141.73,-194.88
  region: -133.85,-194.88 -133.85,-232.28 -122.05,-232.28 -122.05,-194.88
  region: -114.17,-194.88 -114.17,-232.28 -102.36,-232.28 -102.36,-194.88
  region: -94.48,-194.88 -94.48,-232.28 -82.68,-232.28 -82.68,-194.88
  region: -74.8,-194.88 -74.8,-232.28 -62.99,-232.28 -62.99,-194.88
  region: -55.11,-194.88 -55.11,-232.28 -43.31,-232.28 -43.31,-194.88
  region: -35.43,-194.88 -35.43,-232.28 -23.62,-232.28 -23.62,-194.88
  region: -15.68,-194.81 -15.68,-232.35 -3.87,-232.35 -3.87,-194.81
  region: 4.17,-194.65 4.17,-232.5 15.98,-232.5 15.98,-194.65
  region: 24.09,-194.58 24.09,-232.58 35.91,-232.58 35.91,-194.58
  region: 43.6,-195.08 43.6,-232.08 55.4,-232.08 55.4,-195.08
  region: 63.59,-195.08 63.59,-232.08 75.41,-232.08 75.41,-195.08
  region: 83.1,-194.58 83.1,-232.58 94.9,-232.58 94.9,-194.58
  region: 102.59,-195.08 102.59,-232.08 114.41,-232.08 114.41,-195.08
  region: 122.6,-195.08 122.6,-232.08 134.4,-232.08 134.4,-195.08
  region: 142.09,-194.58 142.09,-232.58 153.91,-232.58 153.91,-194.58
  region: 195.3,-141.63 195.3,-153.63 232.7,-153.63 232.7,-141.63
  region: 195.3,-121.95 195.3,-133.95 232.7,-133.95 232.7,-121.95
  region: 195.3,-102.26 195.3,-114.26 232.7,-114.26 232.7,-102.26
  region: 195.3,-82.58 195.3,-94.58 232.7,-94.58 232.7,-82.58
  region: 195.3,-62.89 195.3,-74.89 232.7,-74.89 232.7,-62.89
  region: 195.3,-43.21 195.3,-55.21 232.7,-55.21 232.7,-43.21
  region: 195.3,-23.52 195.3,-35.52 232.7,-35.52 232.7,-23.52
  region: 195.23,-3.77 195.23,-15.77 232.77,-15.77 232.77,-3.77
  region: 195.07,16.07 195.07,4.07 232.93,4.07 232.93,16.07
  region: 195,36 195,24 233,24 233,36
  region: 195.5,55.5 195.5,43.5 232.5,43.5 232.5,55.5
  region: 195.5,75.5 195.5,63.5 232.5,63.5 232.5,75.5
  region: 195,95 195,83 233,83 233,95
  region: 195.5,114.5 195.5,102.5 232.5,102.5 232.5,114.5
  region: 195.5,134.5 195.5,122.5 232.5,122.5 232.5,134.5
  region: 195,154 195,142 233,142 233,154
  region: 142,233 142,195 154,195 154,233
  region: 122.5,232.5 122.5,195.5 134.5,195.5 134.5,232.5
  region: 102.5,232.5 102.5,195.5 114.5,195.5 114.5,232.5
  region: 83,233 83,195 95,195 95,233
  region: 63.5,232.5 63.5,195.5 75.5,195.5 75.5,232.5
  region: 43.5,232.5 43.5,195.5 55.5,195.5 55.5,232.5
  region: 24,233 24,195 36,195 36,233
  region: 4.07,232.93 4.07,195.07 16.07,195.07 16.07,232.93
  region: -15.77,232.77 -15.77,195.23 -3.77,195.23 -3.77,232.77
  region: -35.52,232.7 -35.52,195.3 -23.52,195.3 -23.52,232.7
  region: -55.21,232.7 -55.21,195.3 -43.21,195.3 -43.21,232.7
  region: -74.89,232.7 -74.89,195.3 -62.89,195.3 -62.89,232.7
  region: -94.58,232.7 -94.58,195.3 -82.58,195.3 -82.58,232.7
  region: -114.26,232.7 -114.26,195.3 -102.26,195.3 -102.26,232.7
  region: -133.95,232.7 -133.95,195.3 -121.95,195.3 -121.95,232.7
  region: -153.63,232.7 -153.63,195.3 -141.63,195.3 -141.63,232.7
  lines w8: -193.31,-193.31 -193.31,194 194,194 194,-193.31 -193.31,-193.31

## PBGA144 [mil]
pads (144):
  rrect100% 22x22 smd: A1(-188.98,189) A2(-157.48,189) A3(-125.98,189) A4(-94.49,189) A5(-62.99,189) A6(-31.5,189) A7(0,189) A8(32,189) A9(63,189) A10(95,189) A11(126,189) A12(158,189) A13(189,189) B1(-188.98,158) B2(-157.48,158) B3(-125.98,158) B4(-94.49,158) B5(-62.99,158) B6(-31.5,158) B7(0,158) B8(32,158) B9(63,158) B10(95,158) B11(126,158) B12(158,158) B13(189,158) C1(-188.98,126) C2(-157.48,126) C3(-125.98,126) C4(-94.49,126) C5(-62.99,126) C6(-31.5,126) C7(0,126) C8(32,126) C9(63,126) C10(95,126) C11(126,126) C12(158,126) C13(189,126) D1(-188.98,95) D2(-157.48,95) D3(-125.98,95) D4(-94.49,95) D5(-62.99,95) D6(-31.5,95) D7(0,95) D8(32,95) D9(63,95) D10(95,95) D11(126,95) D12(158,95) D13(189,95) E1(-188.98,63) E2(-157.48,63) E3(-125.98,63) E4(-94.49,63) E10(95,63) E11(126,63) E12(158,63) E13(189,63) F1(-188.98,32) F2(-157.48,32) F3(-125.98,32) F4(-94.49,32) F10(95,32) F11(126,32) F12(158,32) F13(189,32) G1(-188.98,0) G2(-157.48,0) G3(-125.98,0) G4(-94.49,0) G10(95,0) G11(126,0) G12(158,0) G13(189,0) H1(-188.98,-31.5) H2(-157.48,-31.5) H3(-125.98,-31.5) H4(-94.49,-31.5) H10(95,-31.5) H11(126,-31.5) H12(158,-31.5) H13(189,-31.5) J1(-188.98,-62.99) J2(-157.48,-62.99) J3(-125.98,-62.99) J4(-94.49,-62.99) J10(95,-62.99) J11(126,-62.99) J12(158,-62.99) J13(189,-62.99) K1(-188.98,-94.49) K2(-157.48,-94.49) K3(-125.98,-94.49) K4(-94.49,-94.49) K5(-62.99,-94.49) K6(-31.5,-94.49) K7(0,-94.49) K8(32,-94.49) K9(63,-94.49) K10(95,-94.49) K11(126,-94.49) K12(158,-94.49) K13(189,-94.49) L1(-188.98,-125.98) L2(-157.48,-125.98) L3(-125.98,-125.98) L4(-94.49,-125.98) L5(-62.99,-125.98) L6(-31.5,-125.98) L7(0,-125.98) L8(32,-125.98) L9(63,-125.98) L10(95,-125.98) L11(126,-125.98) L12(158,-125.98) L13(189,-125.98) M1(-188.98,-157.48) M2(-157.48,-157.48) M3(-125.98,-157.48) M4(-94.49,-157.48) M5(-62.99,-157.48) M6(-31.5,-157.48) M7(0,-157.48) M8(32,-157.48) M9(63,-157.48) M10(95,-157.48) M11(126,-157.48) M12(158,-157.48) M13(189,-157.48) N1(-188.98,-188.98) N2(-157.48,-188.98) N3(-125.98,-188.98) N4(-94.49,-188.98) N5(-62.99,-188.98) N6(-31.5,-188.98) N7(0,-188.98) N8(32,-188.98) N9(63,-188.98) N10(95,-188.98) N11(126,-188.98) N12(158,-188.98) N13(189,-188.98)
Top Overlay:
  lines w12: -232.28,-232.28 -232.28,205 -204.72,233 233,233 233,-232.28 -232.28,-232.28

## PBGA-N64 [mil]
pads (64):
  rrect100% 20x20 smd: A1(-110.24,111) A2(-78.74,111) A3(-47.24,111) A4(-15.75,111) A5(16,111) A6(48,111) A7(79,111) A8(111,111) B1(-110.24,79) B2(-78.74,79) B3(-47.24,79) B4(-15.75,79) B5(16,79) B6(48,79) B7(79,79) B8(111,79) C1(-110.24,48) C2(-78.74,48) C3(-47.24,48) C4(-15.75,48) C5(16,48) C6(48,48) C7(79,48) C8(111,48) D1(-110.24,16) D2(-78.74,16) D3(-47.24,16) D4(-15.75,16) D5(16,16) D6(48,16) D7(79,16) D8(111,16) E1(-110.24,-15.75) E2(-78.74,-15.75) E3(-47.24,-15.75) E4(-15.75,-15.75) E5(16,-15.75) E6(48,-15.75) E7(79,-15.75) E8(111,-15.75) F1(-110.24,-47.24) F2(-78.74,-47.24) F3(-47.24,-47.24) F4(-15.75,-47.24) F5(16,-47.24) F6(48,-47.24) F7(79,-47.24) F8(111,-47.24) G1(-110.24,-78.74) G2(-78.74,-78.74) G3(-47.24,-78.74) G4(-15.75,-78.74) G5(16,-78.74) G6(48,-78.74) G7(79,-78.74) G8(111,-78.74) H1(-110.24,-110.24) H2(-78.74,-110.24) H3(-47.24,-110.24) H4(-15.75,-110.24) H5(16,-110.24) H6(48,-110.24) H7(79,-110.24) H8(111,-110.24)
Top Overlay:
  rectangle: -157.48,126 -125.98,158
  lines w8: -157.48,-157.48 -157.48,158 158,158 158,-157.48 -157.48,-157.48
Top Solder:
  circle w0: c111,-110.24 r10
  circle w0: c111,-78.74 r10
  circle w0: c111,-47.24 r10
  circle w0: c111,-15.75 r10
  circle w0: c111,16 r10
  circle w0: c111,48 r10
  circle w0: c111,79 r10
  circle w0: c111,111 r10
  circle w0: c79,-110.24 r10
  circle w0: c79,-78.74 r10
  circle w0: c79,-47.24 r10
  circle w0: c79,-15.75 r10
  circle w0: c79,16 r10
  circle w0: c79,48 r10
  circle w0: c79,79 r10
  circle w0: c79,111 r10
  circle w0: c48,-110.24 r10
  circle w0: c48,-78.74 r10
  circle w0: c48,-47.24 r10
  circle w0: c48,-15.75 r10
  circle w0: c48,16 r10
  circle w0: c48,48 r10
  circle w0: c48,79 r10
  circle w0: c48,111 r10
  circle w0: c16,-110.24 r10
  circle w0: c16,-78.74 r10
  circle w0: c16,-47.24 r10
  circle w0: c16,-15.75 r10
  circle w0: c16,16 r10
  circle w0: c16,48 r10
  circle w0: c16,79 r10
  circle w0: c16,111 r10
  circle w0: c-15.75,-110.24 r10
  circle w0: c-15.75,-78.74 r10
  circle w0: c-15.75,-47.24 r10
  circle w0: c-15.75,-15.75 r10
  circle w0: c-15.75,16 r10
  circle w0: c-15.75,48 r10
  circle w0: c-15.75,79 r10
  circle w0: c-15.75,111 r10
  circle w0: c-47.24,-110.24 r10
  circle w0: c-47.24,-78.74 r10
  circle w0: c-47.24,-47.24 r10
  circle w0: c-47.24,-15.75 r10
  circle w0: c-47.24,16 r10
  circle w0: c-47.24,48 r10
  circle w0: c-47.24,79 r10
  circle w0: c-47.24,111 r10
  circle w0: c-78.74,-110.24 r10
  circle w0: c-78.74,-78.74 r10
  circle w0: c-78.74,-47.24 r10
  circle w0: c-78.74,-15.75 r10
  circle w0: c-78.74,16 r10
  circle w0: c-78.74,48 r10
  circle w0: c-78.74,79 r10
  circle w0: c-78.74,111 r10
  circle w0: c-110.24,-110.24 r10
  circle w0: c-110.24,-78.74 r10
  circle w0: c-110.24,-47.24 r10
  circle w0: c-110.24,-15.75 r10
  circle w0: c-110.24,16 r10
  circle w0: c-110.24,48 r10
  circle w0: c-110.24,79 r10
  circle w0: c-110.24,111 r10

## PCBComponent_1 [mil]

## PDIP-T24 [mil]
pads (24):
  round 48 hole 32: 1(-550,-150) 2(-450,-150) 3(-350,-150) 4(-250,-150) 5(-150,-150) 6(-50,-150) 7(50,-150) 8(150,-150) 9(250,-150) 10(350,-150) 11(450,-150) 12(550,-150) 13(550,150) 14(450,150) 15(350,150) 16(250,150) 17(150,150) 18(50,150) 19(-50,150) 20(-150,150) 21(-250,150) 22(-350,150) 23(-450,150) 24(-550,150)
Top Overlay:
  lines w6: -590,-110 -590,-25 ccw(c-590,0) -590,25 -590,110 590,110 590,-110 -590,-110

## PDIP-T28 [mil]
pads (28):
  round 48 hole 32: 1(-650,-150) 2(-550,-150) 3(-450,-150) 4(-350,-150) 5(-250,-150) 6(-150,-150) 7(-50,-150) 8(50,-150) 9(150,-150) 10(250,-150) 11(350,-150) 12(450,-150) 13(550,-150) 14(650,-150) 15(650,150) 16(550,150) 17(450,150) 18(350,150) 19(250,150) 20(150,150) 21(50,150) 22(-50,150) 23(-150,150) 24(-250,150) 25(-350,150) 26(-450,150) 27(-550,150) 28(-650,150)
Top Overlay:
  lines w6: -700,-115 700,-115 700,115 -700,115 -700,40 cw(c-700,0) -700,-40 -700,-115

## PFB_S-PQFP-G48 [mil]
pads (48):
  rect 56x12 smd: 1(-169.29,109) 2(-169.29,89) 3(-169.29,69) 4(-169.29,50) 5(-169.29,30) 6(-169.29,10) 7(-169.29,-9.84) 8(-169.29,-29.53) 9(-169.29,-49.21) 10(-169.29,-68.9) 11(-169.29,-88.58) 12(-169.29,-108.27) 25(170,-108.27) 26(170,-88.58) 27(170,-68.9) 28(170,-49.21) 29(170,-29.53) 30(170,-9.84) 31(170,10) 32(170,30) 33(170,50) 34(170,69) 35(170,89) 36(170,109)
  rect 12x56 smd: 13(-108.27,-169.29) 14(-88.58,-169.29) 15(-68.9,-169.29) 16(-49.21,-169.29) 17(-29.53,-169.29) 18(-9.84,-169.29) 19(10,-169.29) 20(30,-169.29) 21(50,-169.29) 22(69,-169.29) 23(89,-169.29) 24(109,-169.29) 37(109,170) 38(89,170) 39(69,170) 40(50,170) 41(30,170) 42(10,170) 43(-9.84,170) 44(-29.53,170) 45(-49.21,170) 46(-68.9,170) 47(-88.58,170) 48(-108.27,170)
Top Overlay:
  circle w8: c-106.3,105 r10
  lines w8: -133.86,-122.05 -122.05,-133.86 123,-133.86 134,-122.05 134,123 123,134 -122.05,134 -133.86,123 -133.86,-122.05
Top Solder:
  region: -115.27,199.53 -115.27,140.47 -101.27,140.47 -101.27,199.53
  region: -95.58,199.53 -95.58,140.47 -81.58,140.47 -81.58,199.53
  region: -75.9,199.53 -75.9,140.47 -61.9,140.47 -61.9,199.53
  region: -56.21,199.53 -56.21,140.47 -42.21,140.47 -42.21,199.53
  region: -36.53,199.53 -36.53,140.47 -22.53,140.47 -22.53,199.53
  region: -16.69,199.69 -16.69,140.31 -2.69,140.31 -2.69,199.69
  region: 3.16,199.84 3.16,140.16 17.16,140.16 17.16,199.84
  region: 23,200 23,140 37,140 37,200
  region: 42.5,199.5 42.5,140.5 56.5,140.5 56.5,199.5
  region: 62.5,199.5 62.5,140.5 76.5,140.5 76.5,199.5
  region: 82.5,199.5 82.5,140.5 96.5,140.5 96.5,199.5
  region: 101.5,199.5 101.5,140.5 115.5,140.5 115.5,199.5
  region: 199,116 140,116 140,102 199,102
  region: 199,96 140,96 140,82 199,82
  region: 199,76 140,76 140,63 199,63
  region: 199,57 140,57 140,43 199,43
  region: 199,37 140,37 140,23 199,23
  region: 199,17 140,17 140,3 199,3
  region: 199,-2.95 140,-2.95 140,-16.73 199,-16.73
  region: 199,-22.64 140,-22.64 140,-36.42 199,-36.42
  region: 199,-42.32 140,-42.32 140,-56.1 199,-56.1
  region: 199,-62.01 140,-62.01 140,-75.79 199,-75.79
  region: 199,-81.69 140,-81.69 140,-95.47 199,-95.47
  region: 199,-101.38 140,-101.38 140,-115.16 199,-115.16
  region: 115.39,-198.79 115.39,-139.79 101.61,-139.79 101.61,-198.79
  region: 96.39,-198.79 96.39,-139.79 82.61,-139.79 82.61,-198.79
  region: 76.39,-198.79 76.39,-139.79 62.61,-139.79 62.61,-198.79
  region: 56.39,-198.79 56.39,-139.79 42.61,-139.79 42.61,-198.79
  region: 36.89,-199.29 36.89,-139.29 23.11,-139.29 23.11,-199.29
  region: 17.05,-199.13 17.05,-139.45 3.27,-139.45 3.27,-199.13
  region: -2.8,-198.98 -2.8,-139.61 -16.57,-139.61 -16.57,-198.98
  region: -22.64,-198.82 -22.64,-139.76 -36.42,-139.76 -36.42,-198.82
  region: -42.32,-198.82 -42.32,-139.76 -56.1,-139.76 -56.1,-198.82
  region: -62.01,-198.82 -62.01,-139.76 -75.79,-139.76 -75.79,-198.82
  region: -81.69,-198.82 -81.69,-139.76 -95.47,-139.76 -95.47,-198.82
  region: -101.38,-198.82 -101.38,-139.76 -115.16,-139.76 -115.16,-198.82
  rectangle: -198.82,-115.16 -139.76,-101.38
  rectangle: -198.82,-95.47 -139.76,-81.69
  rectangle: -198.82,-75.79 -139.76,-62.01
  rectangle: -198.82,-56.1 -139.76,-42.32
  rectangle: -198.82,-36.42 -139.76,-22.64
  rectangle: -198.82,-16.73 -139.76,-2.95
  rectangle: -198.82,3 -139.76,17
  rectangle: -198.82,23 -139.76,37
  rectangle: -198.82,43 -139.76,57
  rectangle: -198.82,63 -139.76,76
  rectangle: -198.82,82 -139.76,96
  rectangle: -198.82,102 -139.76,116
Mechanical 4:
  drawing of 146 lines, arcs and shapes, not listed

## PLCC20 [mil]
pads (20):
  rect 24x87 smd: 1(0,170) 2(-50,170) 3(-100,170) 9(-100,-169.29) 10(-50,-169.29) 11(0,-169.29) 12(50,-169.29) 13(100,-169.29) 19(100,170) 20(50,170)
  rect 87x24 smd: 4(-169.29,100) 5(-169.29,50) 6(-169.29,0) 7(-169.29,-50) 8(-169.29,-100) 14(170,-100) 15(170,-50) 16(170,0) 17(170,50) 18(170,100)
Mechanical 4:
  circle w24: c0,150 r12
  rectangle: 40,195 61,213
  rectangle: 90,195 111,213
  rectangle: 195,90 213,111
  rectangle: 195,40 213,61
  rectangle: 195,-10.24 213,11
  rectangle: 195,-60.24 213,-39.76
  rectangle: 195,-110.24 213,-89.76
  rectangle: 90,-212.6 111,-194.88
  rectangle: 40,-212.6 61,-194.88
  rectangle: -10.24,-212.6 11,-194.88
  rectangle: -60.24,-212.6 -39.76,-194.88
  rectangle: -110.24,-212.6 -89.76,-194.88
  rectangle: -212.6,-110.24 -194.88,-89.76
  rectangle: -212.6,-60.24 -194.88,-39.76
  rectangle: -212.6,-10.24 -194.88,11
  rectangle: -212.6,40 -194.88,61
  rectangle: -212.6,90 -194.88,111
  rectangle: -110.24,195 -89.76,213
  rectangle: -60.24,195 -39.76,213
  rectangle: -10.24,195 11,213
  lines w8: -192.91,-192.91 193,-192.91 193,193 -104.92,193 -192.91,105 -192.91,-192.91